# Altium footprint library Libraries_2014_0618.PcbLib: 391 footprints (part 24 of 25)
Each footprint in its own frame and in the unit in brackets; x right, y up, seen from the top. Pads: shape width x height; smd on the part's side, far side on the other; paste and mask are expansions set on the pad; w line width, h text height; cw(c..) or ccw(c..) is an arc to the next point about the centre after c.
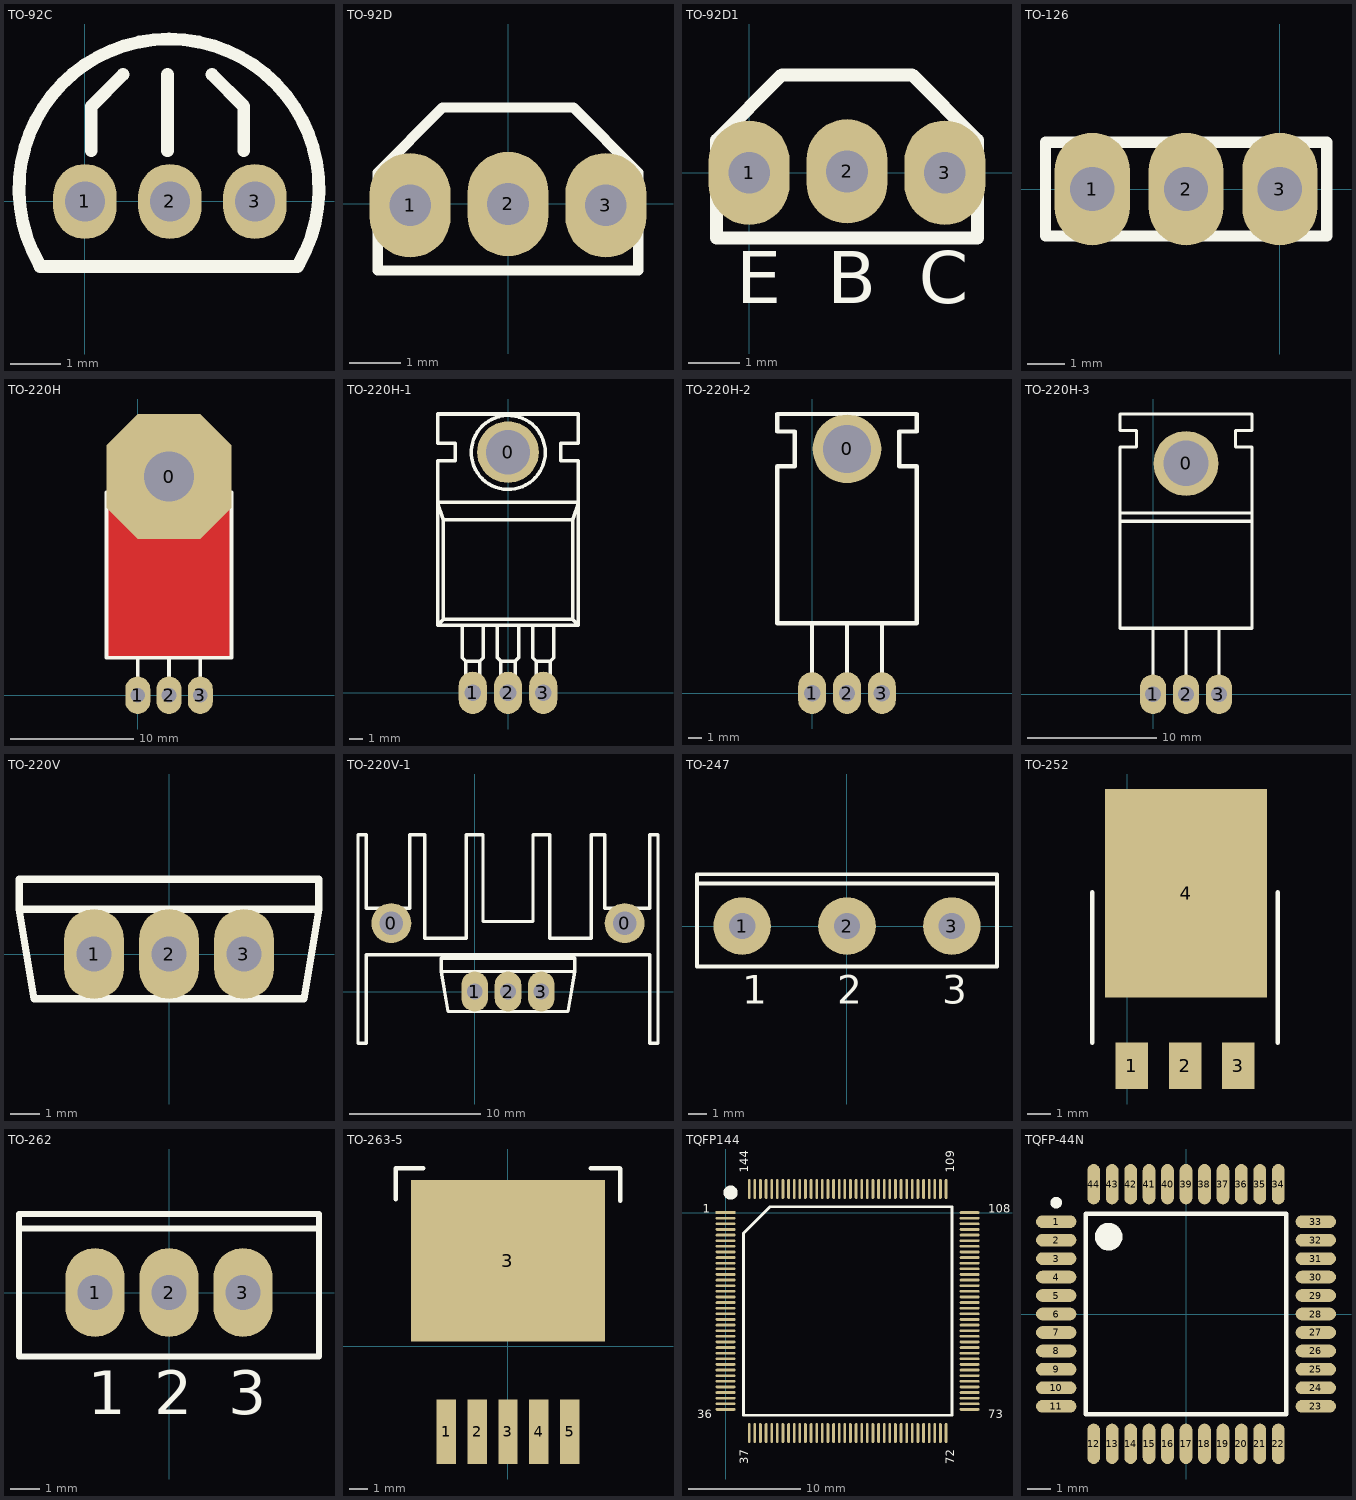
[diagram p23: the footprints below, top view; thin cyan lines are the x and y axes]

## TO-92C [mm]
pads (3):
  oval 1.27x1.5 hole 0.8: 1(0,0) 2(1.7,0) 3(3.4,0)
Top Overlay:
  lines w0.254: -0.918,-1.25 cw(c1.68,0.25) 4.278,-1.25 ; -0.9,-1.3 4.25,-1.3 ; 0.127,1.016 0.127,1.905 0.762,2.54 ; 1.651,1.016 1.651,2.54 ; 2.54,2.54 3.175,1.905 3.175,1.016

## TO-92D [mil]
pads (3):
  oval 62x80 hole 32: 1(-75,-1) 2(0,0) 3(75,-1)
Top Overlay:
  lines w8: -100,-51 100,-51 100,24 50,74 -50,74 -100,24 -100,-51

## TO-92D1 [mil]
pads (3):
  oval 62x80 hole 32: 1(0,0) 2(75,1) 3(150,0)
Top Overlay:
  lines w10: -25,-50 -25,25 25,75 125,75 175,25 175,-50 -25,-50
  text "E" at -10,-100 h40
  text "B" at 60,-100 h40
  text "C" at 130,-100 h40

## TO-126 [mil]
pads (3):
  oval 80x120 hole 47.24: 1(-200,0) 2(-100,0) 3(0,0)
Top Overlay:
  lines w12: -250,-50 -250,50 50,50 50,-50 -250,-50

## TO-220H [mil]
pads (4):
  oct 400x400 hole 160: 0(100,700)
  oval 80x120 hole 47.24: 1(0,0) 2(100,0) 3(200,0)
Top Layer:
  rectangle: -99,126 297,800
Top Overlay:
  lines w12: -100,650 -100,120 300,120 300,650 ; 0,60 0,120 ; 100,60 100,120 ; 200,60 200,120

## TO-220H-1 [mil]
pads (4):
  round 175 hole 125.98: 0(0,683.33)
  oval 80x120 hole 47.24: 1(-100,0) 2(0,0) 3(100,0)
Top Overlay:
  circle w10: c0.67,682.53 r105
  lines w10: -130,191.67 -130,100 -120,90 ; -70,191.67 -70,100 -80,90 ; -30,191.67 -30,100 -20,90 ; 30,191.67 30,100 20,90 ; 70,191.67 70,100 80,90 ; 130,191.67 130,100 120,90 ; -200,191.67 -183.33,208.33 ; -200,191.67 200,191.67 ; -200,191.67 -200,658.33 -150,658.33 -150,708.33 -200,708.33 -200,791.67 200,791.67 200,708.33 150,708.33 150,658.33 200,658.33 200,191.67 ; -183.33,208.33 183.33,208.33 ; -183.33,208.33 -183.33,491.67 ; -183.33,491.67 183.33,491.67 ; -183.33,491.67 -200,541.67 200,541.67 183.33,491.67 ; -120,90 -80,90 ; -120,90 -120,50 -80,50 -80,90 ; -20,90 20,90 ; -20,90 -20,50 20,50 20,90 ; 80,90 120,90 ; 80,90 80,50 120,50 120,90 ; 183.33,208.33 200,191.67 ; 183.33,208.33 183.33,491.67

## TO-220H-2 [mil]
pads (4):
  round 196.85 hole 137.8: 0(100,700)
  oval 80x120 hole 47.24: 1(0,0) 2(100,0) 3(200,0)
Top Overlay:
  lines w12: 0,60 0,200 ; 100,60 100,200 ; 200,60 200,200 ; -100,200 300,200 300,650 250,650 250,750 300,750 300,800 -100,800 -100,750 -50,750 -50,650 -100,650 -100,200

## TO-220H-3 [mil]
pads (4):
  round 196.85 hole 137.8: 0(100,700)
  oval 80x120 hole 47.24: 1(0,0) 2(100,0) 3(200,0)
Top Overlay:
  lines w10: -100,525 300,525 ; 0,50 0,200 ; 100,50 100,200 ; 200,50 200,200 ; -100,550 300,550 ; -100,550 -100,750 -50,750 -50,800 -100,800 -100,850 300,850 300,800 250,800 250,750 300,750 300,550 ; -100,550 -100,200 300,200 300,550

## TO-220V [mil]
pads (3):
  oval 80x120 hole 47.24: 1(-100,0) 2(0,0) 3(100,0)
Top Overlay:
  lines w10: -200,60 200,60 ; -200,60 -180,-60 180,-60 200,60 ; -200,60 -200,100 200,100 200,60

## TO-220V-1 [mil] "焊孔17.9mm  23mmX16mm"
height 984.25
pads (5):
  round 120 hole 70: 0(-250,205) 0(450,205)
  oval 80x120 hole 47.24: 1(0,0) 2(100,0) 3(200,0)
Top Overlay:
  lines w10: -100,60 300,60 ; -100,60 -80,-60 280,-60 300,60 ; -100,60 -100,100 300,100 300,60 ; -350,-155 -325,-155 -325,110 525,110 525,-155 550,-155 550,470 525,470 525,250 390,250 390,470 350,470 350,160 225,160 225,470 175,470 175,210 25,210 25,470 -25,470 -25,160 -150,160 -150,470 -195,470 -195,250 -325,250 -325,470 -350,470 -350,-155

## TO-247 [mil] "SIP with Mounting Hole; 3 Leads; Body 20.6 x 15.6 x 4.7 mm (typ); Pitch 5.56 mm"
height 976.38
pads (3):
  round 120 hole 55.12: 1(-218.9,0) 2(0,0) 3(218.9,0)
Top Overlay:
  lines w7.87: -312.99,88.58 310.63,88.58 ; -312.99,-84.65 -312.99,108.27 312.99,108.27 312.99,-84.65 -312.99,-84.65
  text "3" at 198.9,-162.4 h59.06
  text "2" at -20,-162.4 h59.06
  text "1" at -218.9,-162.4 h59.06

## TO-252 [mm] "D2-PAK, 4-Pads, Body 9.4x10.3mm (max), IPC Medium Density"
height 4.83
pads (4):
  rect 1.4x2 smd: 1(0.2,2.5) 2(2.5,2.5) 3(4.8,2.5)
  rect 7x9 smd: 4(2.54,9.95)
Top Overlay:
  lines w0.2: -1.5,3.5 -1.5,10 ; 6.5,3.5 6.5,10

## TO-262 [mil] "TO, Thru-Hole, Vertical, Heatsink Mounted; 3 In-Line Leads; Pitch 2.54 mm"
height 555.12
pads (3):
  oval 80x120 hole 47.24: 1(-100,0) 2(0,0) 3(100,0)
Top Overlay:
  lines w7.87: -202.76,86.61 202.76,86.61 ; -202.76,-86.61 -202.76,106.3 202.76,106.3 202.76,-86.61 -202.76,-86.61
  text "3" at 80.31,-164.37 h59.06
  text "2" at -19.68,-164.37 h59.06
  text "1" at -109.84,-164.37 h59.06

## TO-263-5 [mil]
pads (6):
  rect 42x140 smd: 1(-134,-185) 2(-67,-185) 3(0,-185) 4(67,-185) 5(134,-185)
  rect 420x350 smd: 3(0,185)
Top Overlay:
  lines w10: -243,319 -243,386 -184,386 ; 179,386 242,386 243,385 243,315

## TQFP144 [mil]
pads (144):
  rect 70x9.5 smd: 1(0,0)
  oval 70x9.5 smd: 2(0,-19.68) 3(0,-39.37) 4(0,-59.05) 5(0,-78.74) 6(0,-98.42) 7(0,-118.11) 8(0,-137.79) 9(0,-157.48) 10(0,-177.16) 11(0,-196.85) 12(0,-216.53) 13(0,-236.22) 14(0,-255.91) 15(0,-275.59) 16(0,-295.27) 17(0,-314.96) 18(0,-334.64) 19(0,-354.33) 20(0,-374.01) 21(0,-393.7) 22(0,-413.38) 23(0,-433.07) 24(0,-452.75) 25(0,-472.44) 26(0,-492.12) 27(0,-511.81) 28(0,-531.5) 29(0,-551.18) 30(0,-570.87) 31(0,-590.55) 32(0,-610.24) 33(0,-629.92) 34(0,-649.61) 35(0,-669.29) 36(0,-688.98) 73(854.33,-688.98) 74(854.33,-669.29) 75(854.33,-649.61) 76(854.33,-629.92) 77(854.33,-610.24) 78(854.33,-590.55) 79(854.33,-570.87) 80(854.33,-551.18) 81(854.33,-531.5) 82(854.33,-511.81) 83(854.33,-492.12) 84(854.33,-472.44) 85(854.33,-452.75) 86(854.33,-433.07) 87(854.33,-413.38) 88(854.33,-393.7) 89(854.33,-374.01) 90(854.33,-354.33) 91(854.33,-334.64) 92(854.33,-314.96) 93(854.33,-295.27) 94(854.33,-275.59) 95(854.33,-255.91) 96(854.33,-236.22) 97(854.33,-216.53) 98(854.33,-196.85) 99(854.33,-177.16) 100(854.33,-157.48) 101(854.33,-137.79) 102(854.33,-118.11) 103(854.33,-98.42) 104(854.33,-78.74) 105(854.33,-59.05) 106(854.33,-39.37) 107(854.33,-19.68) 108(854.33,0)
  oval 9.5x70 smd: 37(82.68,-771.65) 38(102.36,-771.65) 39(122.05,-771.65) 40(141.73,-771.65) 41(161.42,-771.65) 42(181.1,-771.65) 43(200.79,-771.65) 44(220.47,-771.65) 45(240.16,-771.65) 46(259.84,-771.65) 47(279.53,-771.65) 48(299.21,-771.65) 49(318.9,-771.65) 50(338.58,-771.65) 51(358.27,-771.65) 52(377.95,-771.65) 53(397.64,-771.65) 54(417.32,-771.65) 55(437.01,-771.65) 56(456.69,-771.65) 57(476.38,-771.65) 58(496.06,-771.65) 59(515.75,-771.65) 60(535.43,-771.65) 61(555.12,-771.65) 62(574.8,-771.65) 63(594.49,-771.65) 64(614.17,-771.65) 65(633.86,-771.65) 66(653.54,-771.65) 67(673.23,-771.65) 68(692.91,-771.65) 69(712.6,-771.65) 70(732.28,-771.65) 71(751.97,-771.65) 72(771.65,-771.65) 109(771.65,82.68) 110(751.97,82.68) 111(732.28,82.68) 112(712.6,82.68) 113(692.91,82.68) 114(673.23,82.68) 115(653.54,82.68) 116(633.86,82.68) 117(614.17,82.68) 118(594.49,82.68) 119(574.8,82.68) 120(555.12,82.68) 121(535.43,82.68) 122(515.75,82.68) 123(496.06,82.68) 124(476.38,82.68) 125(456.69,82.68) 126(437.01,82.68) 127(417.32,82.68) 128(397.64,82.68) 129(377.95,82.68) 130(358.27,82.68) 131(338.58,82.68) 132(318.9,82.68) 133(299.21,82.68) 134(279.53,82.68) 135(259.84,82.68) 136(240.16,82.68) 137(220.47,82.68) 138(200.79,82.68) 139(181.1,82.68) 140(161.42,82.68) 141(141.73,82.68) 142(122.05,82.68) 143(102.36,82.68) 144(82.68,82.68)
Top Overlay:
  circle w25: c17.5,70 r12.5
  lines w10: 62.4,-709.25 791.93,-709.25 791.93,20.28 155.28,20.28 62.4,-72.6 62.4,-709.25
  text "144" at 80,140 h30
  text "109" at 800,140 h30
  text "108" at 920,0 h30
  text "73" at 920,-720 h30
  text "37" at 80,-880 h30
  text "36" at -100,-720 h30
  text "1" at -80,0 h30
  text "72" at 800,-880 h30

## TQFP-44N [mm] "TQFP, 44-Leads, Body 12.3x12.3mm (max), Pitch 0.80mm"
height 1.2
pads (44):
  oval 1.75x0.55 smd: 1(-5.625,4) 2(-5.625,3.2) 3(-5.625,2.4) 4(-5.625,1.6) 5(-5.625,0.8) 6(-5.625,0) 7(-5.625,-0.8) 8(-5.625,-1.6) 9(-5.625,-2.4) 10(-5.625,-3.2) 11(-5.625,-4) 23(5.625,-4) 24(5.625,-3.2) 25(5.625,-2.4) 26(5.625,-1.6) 27(5.625,-0.8) 28(5.625,0) 29(5.625,0.8) 30(5.625,1.6) 31(5.625,2.4) 32(5.625,3.2) 33(5.625,4)
  oval 0.55x1.75 smd: 12(-4,-5.625) 13(-3.2,-5.625) 14(-2.4,-5.625) 15(-1.6,-5.625) 16(-0.8,-5.625) 17(0,-5.625) 18(0.8,-5.625) 19(1.6,-5.625) 20(2.4,-5.625) 21(3.2,-5.625) 22(4,-5.625) 34(4,5.625) 35(3.2,5.625) 36(2.4,5.625) 37(1.6,5.625) 38(0.8,5.625) 39(0,5.625) 40(-0.8,5.625) 41(-1.6,5.625) 42(-2.4,5.625) 43(-3.2,5.625) 44(-4,5.625)
Top Overlay:
  circle w0.25: c-5.625,4.825 r0.125
  circle w0.6: c-3.35,3.35 r0.3
  lines w0.2: -4.35,-4.35 -4.35,4.35 4.35,4.35 4.35,-4.35 -4.35,-4.35